# Altium footprint library THD Passive Components.PcbLib: 72 footprints (part 4 of 5)
Each footprint in its own frame and in the unit in brackets; x right, y up, seen from the top. Pads: shape width x height; smd on the part's side, far side on the other; paste and mask are expansions set on the pad; w line width, h text height; cw(c..) or ccw(c..) is an arc to the next point about the centre after c.
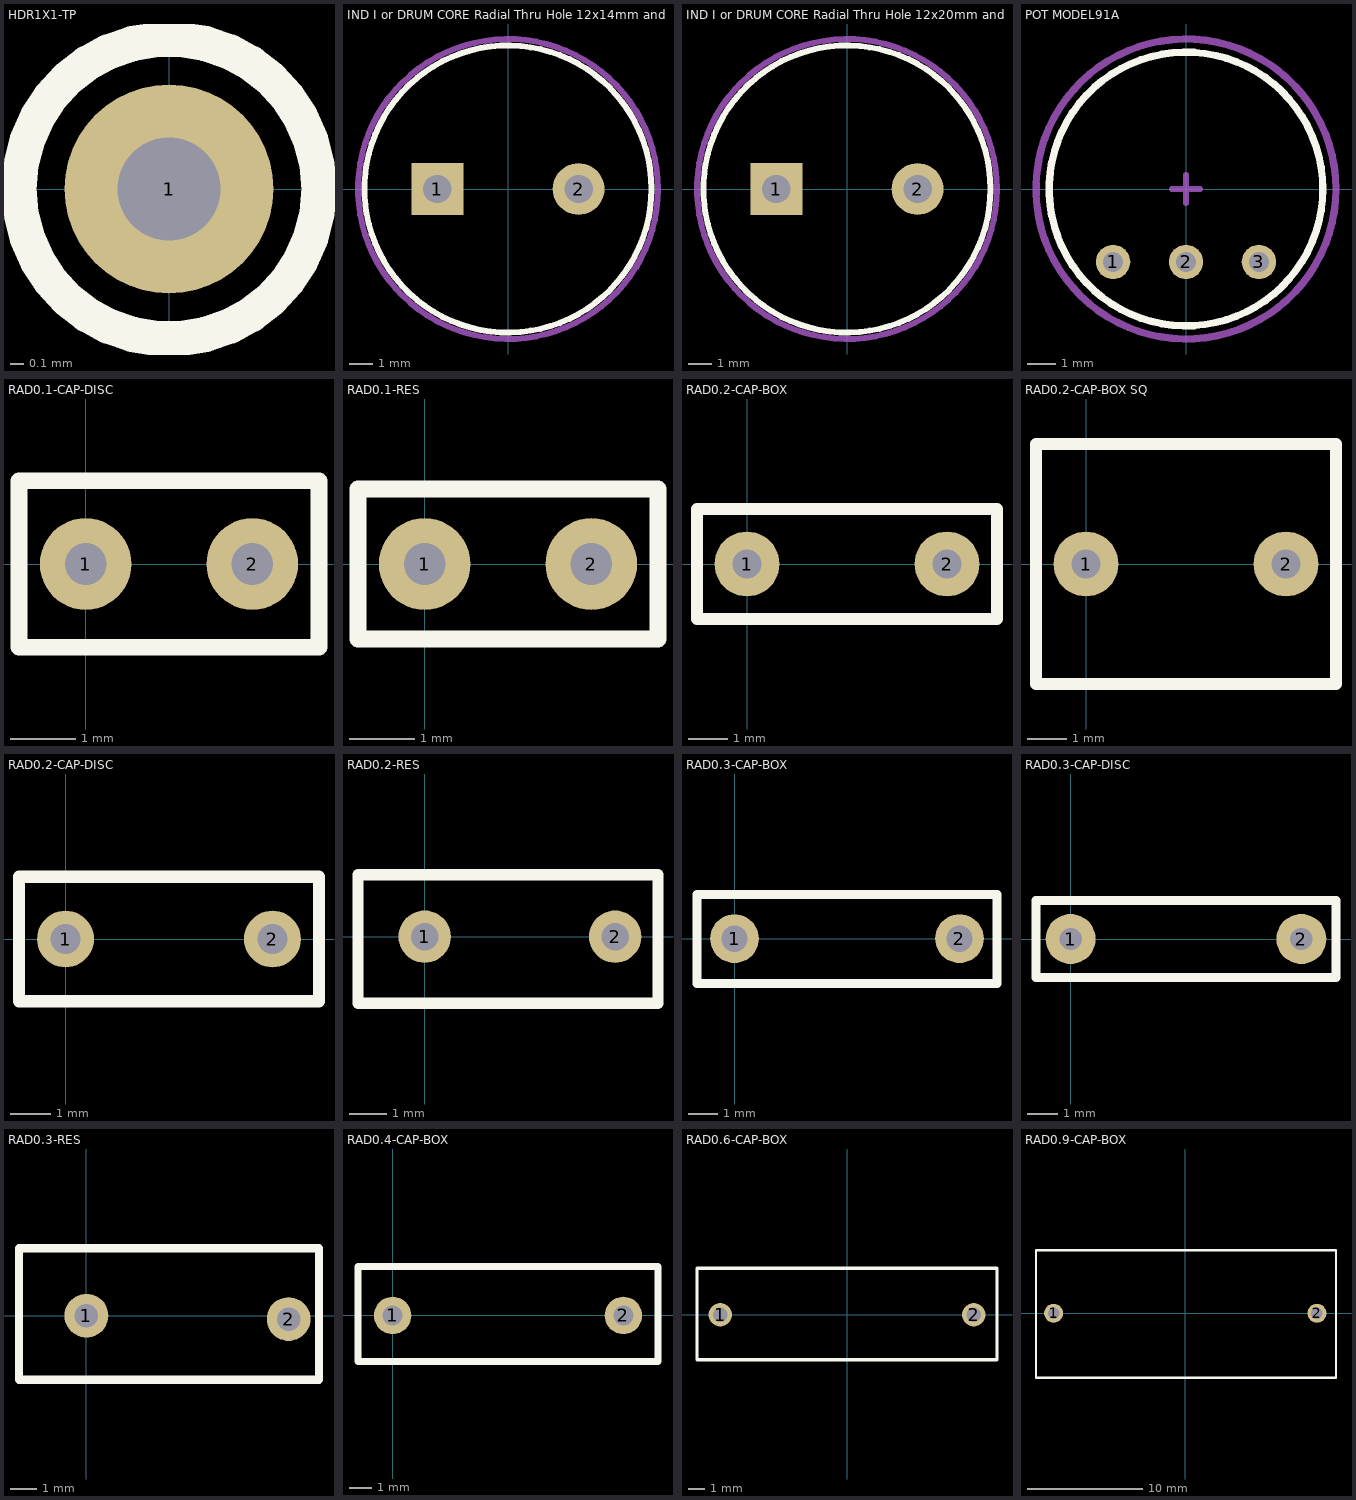
[diagram p3: the footprints below, top view; thin cyan lines are the x and y axes]

## HDR1X1-TP [mm] "Connector; Header; 2 Position"
pads (1):
  round 1.5 hole 0.737: 1(0,0)
Top Overlay:
  circle w0.254: c0,0 r1.078
3D body "Test Point Single Pin.STEP": height 6.5, standoff -3, extent -0.508,-0.492 0.492,0.508

## IND I or DRUM CORE Radial Thru Hole 12x14mm and Pitch 6mm [mm]
pads (2):
  rect 2.2x2.2 hole 1.2: 1(-3,0)
  round 2.2 hole 1.2: 2(3,0)
Top Overlay:
  circle w0.254: c0,0 r6.096
Mechanical 15:
  circle w0.254: c0,0 r6.37
3D body "INDUCTOR I or DRUM CORE Radial Thru Hole 12x14mm and Pitch 6mm.STEP": height 14, standoff -4.97, extent -6.001,-6.006 6.001,6.006

## IND I or DRUM CORE Radial Thru Hole 12x20mm and Pitch 6mm [mm]
pads (2):
  rect 2.2x2.2 hole 1.2: 1(-3,0)
  round 2.2 hole 1.2: 2(3,0)
Top Overlay:
  circle w0.254: c0,0 r6.096
Mechanical 15:
  circle w0.254: c0,0 r6.37
3D body "ICORE Beyaz 12x20-2.STEP": height 20.07, standoff -5, extent -6.014,-6.013 6.014,6.028

## POT MODEL91A [mm]
height 5.08
pads (3):
  round 1.2 hole 0.7: 1(-2.54,-2.54) 2(0,-2.54) 3(2.54,-2.54)
Top Overlay:
  circle w0.254: c0,0 r4.763
Mechanical 15:
  circle w0.254: c0,0 r5.22
  lines w0.2: -0.5,0 0.5,0 ; 0,-0.5 0,0.5
3D body "91A-1 mod.STEP": height 4.89, standoff -1.79, extent -4.681,-4.877 4.681,4.699

## RAD0.1-CAP-DISC [mil]
pads (2):
  round 55 hole 25: 1(0,0) 2(100,0)
Top Overlay:
  lines w10: -40,-50 -40,50 140,50 140,-50 -40,-50
3D body "THD Cap Rad Disc P2.54mm WLH1.5x3.5x5mm RED.STEP": height 243.67, standoff -123.88, extent -42.51,-48.43 142.51,50

## RAD0.1-RES [mil]
pads (2):
  round 55 hole 25: 1(0,0) 2(100,0)
Top Overlay:
  lines w10: -40,-45 -40,45 140,45 140,-45 -40,-45
3D body "THD Res Rad P2.54mm WLH2.5x4x6.5mm RED.STEP": height 254.56, standoff -98.43, extent -40,-42.54 110.13,40

## RAD0.2-CAP-BOX [mil]
pads (2):
  round 65 hole 29: 1(0,0) 2(200,0)
Top Overlay:
  lines w12: -50,-55 -50,55 250,55 250,-55 -50,-55
3D body "THD Cap Rad Box P5.08mm WLH2.2x7.2x7.0mm YEL.STEP": height 262.89, standoff -85.22, extent -45.94,-52.47 245.4,50

## RAD0.2-CAP-BOX SQ [mil]
pads (2):
  round 65 hole 29: 1(0,0) 2(200,0)
Top Overlay:
  lines w12: -50,-120 -50,120 250,120 250,-120 -50,-120
3D body "THD Cap Rad Box P5.08mm WLH6.2x7.6x11mm YEL.STEP": height 439.65, standoff -194.21, extent -47.46,-120.21 247.81,120

## RAD0.2-CAP-DISC [mil]
pads (2):
  round 55 hole 29: 1(0,0) 2(200,0)
Top Overlay:
  lines w12: -45,-60 -45,60 245,60 245,-60 -45,-60
3D body "THD Cap Rad Disc P5.08mm YEL.STEP": height 176, standoff -118.11, extent -8.85,-59.05 208.86,59.06

## RAD0.2-RES [mil]
pads (2):
  round 55 hole 29: 1(0,0) 2(200,0)
Top Overlay:
  lines w12: -70,-70 -70,65 245,65 245,-70 -70,-70
3D body "THD Res Rad P5.08mm WLH4x7x12.5mm RED.STEP": height 483.26, standoff -98.43, extent -71.69,-70.87 210,70.87

## RAD0.3-CAP-BOX [mil]
pads (2):
  round 65 hole 35: 1(0,0) 2(300,0)
Top Overlay:
  lines w12: -50,-60 -50,59.06 350,59.06 350,-60 -50,-60
3D body "THD Cap Rad Box P7.62mm WLH3x10x8.5mm YEL.STEP": height 324.8, standoff -116.38, extent -46.85,-59.05 346.85,59.06

## RAD0.3-CAP-DISC [mil]
pads (2):
  round 65 hole 29: 1(0,0) 2(300,0)
Top Overlay:
  lines w12: -45,-50 -45,50 345,50 345,-50 -45,-50
3D body "THD Cap Rad Disc P7.62mm ORN.STEP": height 349.86, standoff -170.14, extent -7.5,-47.1 307.5,47.11

## RAD0.3-RES [mil]
pads (2):
  round 65 hole 35: 1(0,0) 2(300,-5)
Top Overlay:
  lines w12: -100,-95 -100,100 345,100 345,-95 -100,-95
3D body "THD Res Rad P7.62mm WLH5x11x17mm BLU.STEP": height 649.84, standoff -98.43, extent -97.09,-96.85 317.09,100

## RAD0.4-CAP-BOX [mil]
pads (2):
  round 65 hole 35: 1(0,0) 2(400,0)
Top Overlay:
  lines w12: -60,-80 460,-80 460,85 -60,85 -60,-80
3D body "THD Cap Rad Box P10.1mm WLH4.2x13.2x9.0mm YEL.STEP": height 361.91, standoff -103.31, extent -59.93,-80.42 459.75,85

## RAD0.6-CAP-BOX [mm] "Axial Device, Thru-Hole; 2 Leads; 0.6 in Pin Spacing"
height 2.54
pads (2):
  round 1.4 hole 0.889: 1(-7.62,0) 2(7.62,0)
Top Overlay:
  lines w0.2: -9.017,-2.707 9.017,-2.707 9.017,2.794 -9.017,2.794 -9.017,-2.707
3D body "THD Cap Rad Box P15.24mm WLH5.6x18x12.5mm YEL.STEP": height 12.55, standoff -2.43, extent -9.017,-2.707 8.983,2.794

## RAD0.9-CAP-BOX [mm] "Axial Device, Thru-Hole; 2 Leads; 0.9 in Pin Spacing"
height 5.08
pads (2):
  round 1.65 hole 1: 1(-11.43,0) 2(11.43,0)
Top Overlay:
  lines w0.2: -12.954,-5.588 13.081,-5.588 13.081,5.461 -12.954,5.461 -12.954,-5.588
3D body "THD Cap Rad Box P22.86mm WLH11x25x21mm YEL.STEP": height 21.72, standoff -4.01, extent -12.978,-5.54 13.022,5.461